# Altium footprint library AltiumLibraryOld.PcbLib: 82 footprints (part 5 of 6)
Each footprint in its own frame and in the unit in brackets; x right, y up, seen from the top. Pads: shape width x height; smd on the part's side, far side on the other; paste and mask are expansions set on the pad; w line width, h text height; cw(c..) or ccw(c..) is an arc to the next point about the centre after c.
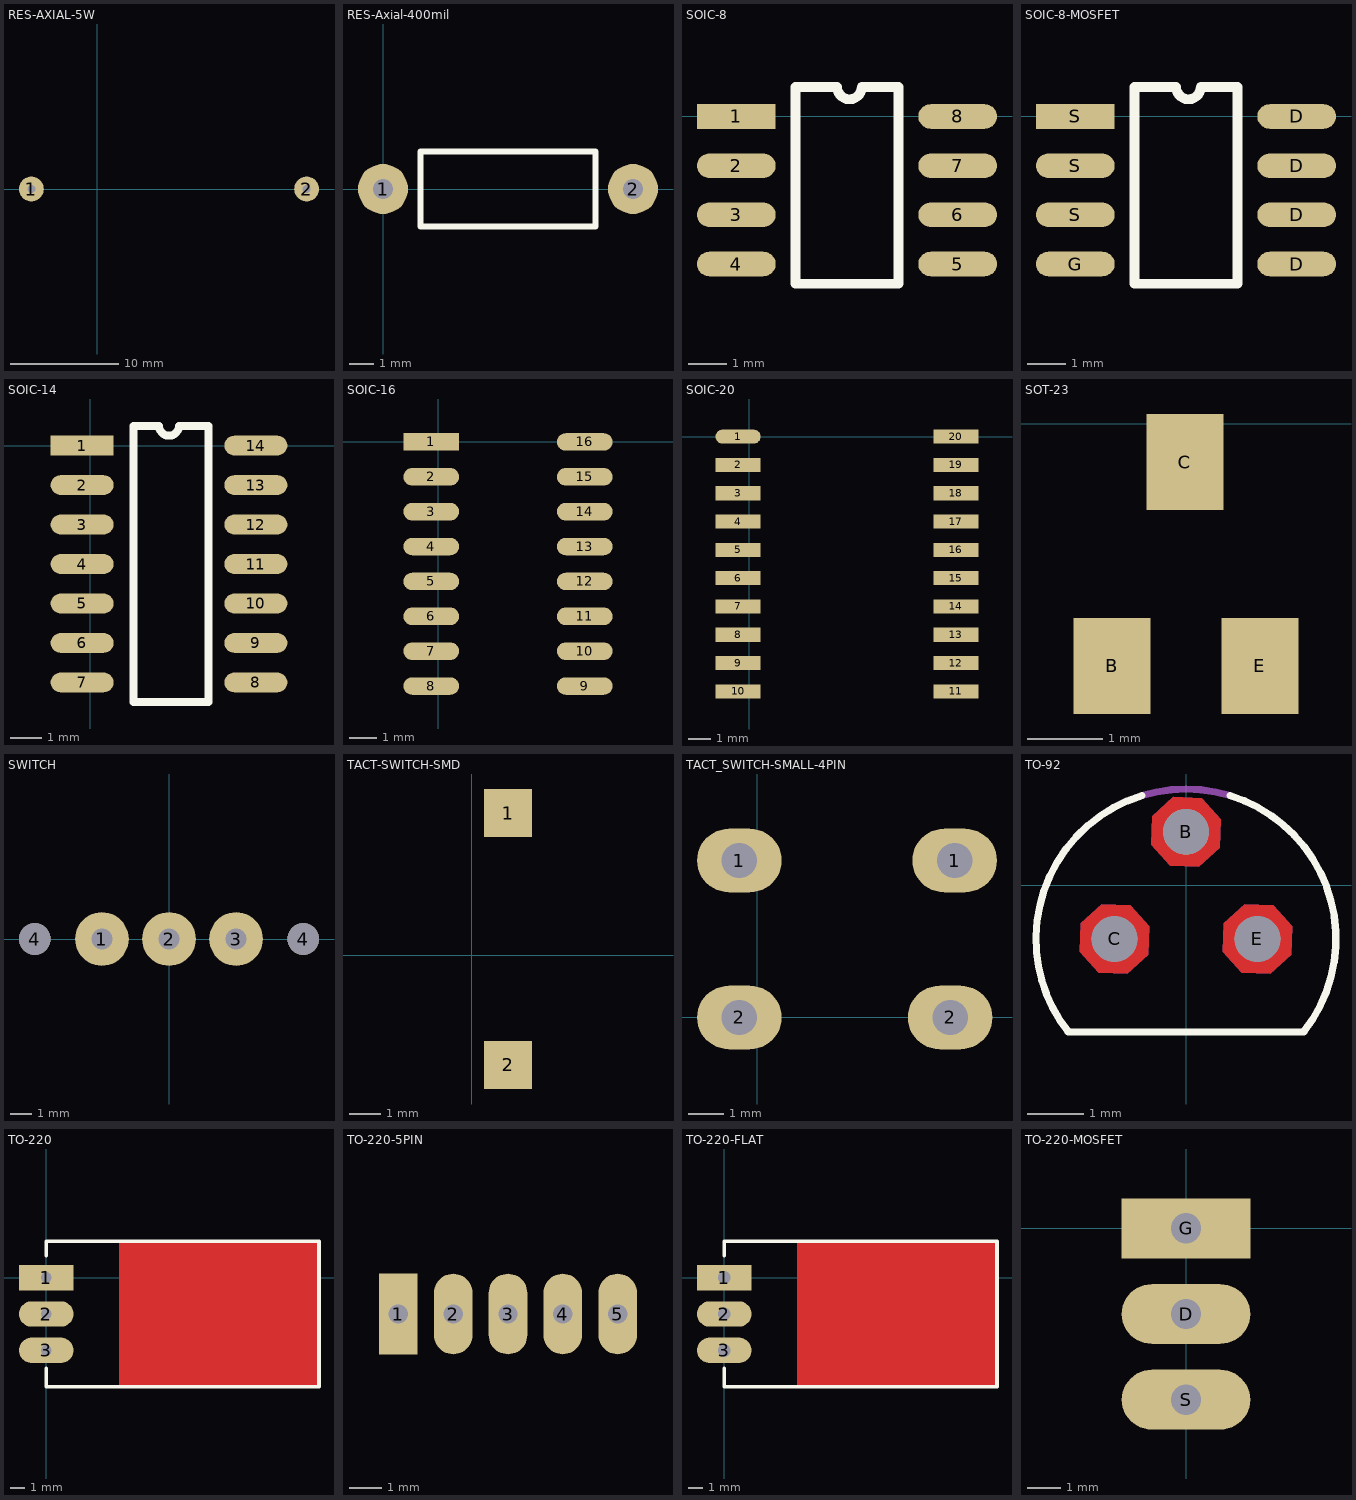
[diagram p4: the footprints below, top view; thin cyan lines are the x and y axes]

## RES-AXIAL-5W [mil]
pads (2):
  round 90 hole 30: 1(-240,0) 2(760,0)
3D body "User Library-Resistor 5W Length 22mm, pitch 1in.step": height 357.17, standoff -211.32, extent -255.74,-187 775.75,187.01

## RES-Axial-400mil [mil]
pads (2):
  round 80 hole 31.5: 1(0,0) 2(400,0)
Top Overlay:
  lines w10: 60,-60 340,-60 340,60 60,60 60,0 60,-60
3D body "SW3dPS-resistor - fixed.STEP": height 94, standoff -110, extent -12,-44 410,44

## SOIC-8 [mil]
pads (8):
  rect 80x25 smd: 1(215,0)
  oval 80x25 smd: 2(215,-50) 3(215,-100) 4(215,-150) 5(440,-150) 6(440,-100) 7(440,-50) 8(440,0)
Top Overlay:
  lines w10: 275,-170 380,-170 380,30 342.5,30 cw(c330,30) 317.5,30 275,30 275,-170
3D body "User Library-SOIC-8-1.step": height 68.9, standoff 0, extent 211.9,-171.46 448.12,21.46

## SOIC-8-MOSFET [mil]
pads (8):
  oval 80x25 smd: D(440,-150) D(440,-100) D(440,-50) D(440,0) G(215,-150) S(215,-100) S(215,-50)
  rect 80x25 smd: S(215,0)
Top Overlay:
  lines w10: 275,-170 380,-170 380,30 342.5,30 cw(c330,30) 317.5,30 275,30 275,-170
3D body "User Library-SOIC-8-1.step": height 68.9, standoff 0, extent 211.9,-171.46 448.12,21.46

## SOIC-14 [mil]
pads (14):
  rect 80x25 smd: 1(-10,0)
  oval 80x25 smd: 2(-10,-50) 3(-10,-100) 4(-10,-150) 5(-10,-200) 6(-10,-250) 7(-10,-300) 8(210,-300) 9(210,-250) 10(210,-200) 11(210,-150) 12(210,-100) 13(210,-50) 14(210,0)
Top Overlay:
  lines w10: 55,-325 150,-325 150,25 112.5,25 cw(c100,25) 87.5,25 55,25 55,-325
3D body "User Library-SOIC14-150.step": height 68.9, standoff 0, extent -19.16,-318.31 209.18,18.31

## SOIC-16 [mil]
pads (16):
  rect 80x25 smd: 1(-10,0)
  oval 80x25 smd: 2(-10,-50) 3(-10,-100) 4(-10,-150) 5(-10,-200) 6(-10,-250) 7(-10,-300) 8(-10,-350) 9(210,-350) 10(210,-300) 11(210,-250) 12(210,-200) 13(210,-150) 14(210,-100) 15(210,-50) 16(210,0)
3D body "User Library-SOIC-16-1.step": height 55.12, standoff 0, extent -18.1,-369.88 218.12,19.89

## SOIC-20 [mil]
pads (20):
  oval 80x25 smd: 1(-20,0)
  rect 80x25 smd: 2(-20,-50) 3(-20,-100) 4(-20,-150) 5(-20,-200) 6(-20,-250) 7(-20,-300) 8(-20,-350) 9(-20,-400) 10(-20,-450) 11(365,-450) 12(365,-400) 13(365,-350) 14(365,-300) 15(365,-250) 16(365,-200) 17(365,-150) 18(365,-100) 19(365,-50) 20(365,0)
3D body "User Library-SOIC20-300.step": height 106.33, standoff 2, extent -30.51,-475 375,28.94

## SOT-23 [mil]
pads (3):
  rect 40x50 smd: B(237.2,-125.98) C(275,-20) E(313.98,-125.98)
3D body "User Library-3-lead sot23-3.step": height 37.59, standoff -2.57, extent 218.11,-124.01 333.08,-26.53

## SWITCH [mm]
pads (5):
  round 2.54 hole 1: 1(-3.175,0) 2(0,0) 3(3.175,0)
  round 1.5 hole 1.5: 4(-6.35,0) 4(6.35,0)
3D body "User Library-SLB12814.STEP": height 9.65, standoff -2.6, extent -7,-3.1 7,3.1

## TACT-SWITCH-SMD [mil]
pads (2):
  rect 60x60 smd: 1(45,177.49) 2(45,-137.48)
3D body "User Library-Tact switch 1181_3.step": height 94.49, standoff -3.94, extent -25.86,-137.48 115.87,177.49

## TACT_SWITCH-SMALL-4PIN [mm]
pads (4):
  oval 2.4x1.8 hole 1: 1(-0.508,4.445) 1(5.588,4.445) 2(-0.508,0) 2(5.461,0)
3D body "User Library-TPxxxx (Switch).STEP": height 5.15, standoff -3.34, extent -1.449,-0.793 6.529,5.207

## TO-92 [mil]
pads (3):
  round 32 hole 32: B(0,37.5) C(-50,-37.5) E(50,-37.5)
Top Layer:
  region: 74.43,-28.61 60.99,-13.94 41.11,-13.07 26.44,-26.51 25.57,-46.39 39.01,-61.06 58.89,-61.93 73.56,-48.49
  region: 24.43,46.39 10.99,61.06 -8.89,61.93 -23.56,48.49 -24.43,28.61 -10.99,13.94 8.89,13.07 23.56,26.51
  region: -25.57,-28.61 -39.01,-13.94 -58.89,-13.07 -73.56,-26.51 -74.43,-46.39 -60.99,-61.06 -41.11,-61.93 -26.44,-48.49
Bottom Layer:
  region: 74.43,-28.61 60.99,-13.94 41.11,-13.07 26.44,-26.51 25.57,-46.39 39.01,-61.06 58.89,-61.93 73.56,-48.49
  region: 24.43,46.39 10.99,61.06 -8.89,61.93 -23.56,48.49 -24.43,28.61 -10.99,13.94 8.89,13.07 23.56,26.51
  region: -25.57,-28.61 -39.01,-13.94 -58.89,-13.07 -73.56,-26.51 -74.43,-46.39 -60.99,-61.06 -41.11,-61.93 -26.44,-48.49
Top Overlay:
  lines w5: -82.74,-102.15 cw(c0,-37.5) -104.6,-46.65 cw(c0,-37.5) -30.7,62.91 ; -82.46,-102.5 82.46,-102.5 ; 30.7,62.91 cw(c0,-37.5) 82.74,-102.14
Mechanical 1:
  lines w5: -30.7,62.91 cw(c0,-37.5) 30.7,62.91
Multi-Layer:
  region: 74.43,-28.61 60.99,-13.94 41.11,-13.07 26.44,-26.51 25.57,-46.39 39.01,-61.06 58.89,-61.93 73.56,-48.49
  region: 24.43,46.39 10.99,61.06 -8.89,61.93 -23.56,48.49 -24.43,28.61 -10.99,13.94 8.89,13.07 23.56,26.51
  region: -25.57,-28.61 -39.01,-13.94 -58.89,-13.07 -73.56,-26.51 -74.43,-46.39 -60.99,-61.06 -41.11,-61.93 -26.44,-48.49
3D body "TO-92.STEP": height 290.16, standoff -118.11, extent -95.08,-77.4 95.08,57.64

## TO-220 [mil]
pads (3):
  rect 150x70 hole 30: 1(0,0)
  oval 150x70 hole 30: 2(0,-100) 3(0,-200)
Top Layer:
  rectangle: 200,-300 750,100
Top Overlay:
  lines w10: 0,-250 0,-300 750,-300 750,100 20,100 0,100 0,60
3D body "User Library-to-220.step": height 195.2, standoff -50.28, extent -4.53,-300 754.52,100

## TO-220-5PIN [mm]
pads (5):
  rect 1.2x2.5 hole 0.6: 1(2.54,-8.128)
  oval 1.2x2.5 hole 0.6: 2(4.24,-8.128) 3(5.94,-8.128) 4(7.64,-8.128) 5(9.34,-8.128)
3D body "User Library-TO220-5T PCB.step": height 17, standoff -6.57, extent 0.88,-11.035 11,-6.578

## TO-220-FLAT [mil]
pads (3):
  rect 150x70 hole 35.43: 1(0,0)
  oval 150x70 hole 35.43: 2(0,-100) 3(0,-200)
Top Layer:
  rectangle: 200,-300 750,100
Top Overlay:
  lines w10: 0,-250 0,-300 750,-300 750,100 20,100 0,100 0,60
3D body "User Library-to-220.step": height 195.2, standoff -50.28, extent -4.53,-300 754.52,100

## TO-220-MOSFET [mil]
pads (3):
  oval 150x70 hole 35.43: D(0,-100) S(0,-200)
  rect 150x70 hole 35.43: G(0,0)
3D body "User Library-Transistor TO 220.step": height 661.42, standoff -354.33, extent -63.58,-305 113.58,100.51